# Altium footprint library PCB_Wearing_sensor.PcbLib: 55 footprints (part 3 of 4)
Each footprint in its own frame and in the unit in brackets; x right, y up, seen from the top. Pads: shape width x height; smd on the part's side, far side on the other; paste and mask are expansions set on the pad; w line width, h text height; cw(c..) or ccw(c..) is an arc to the next point about the centre after c.
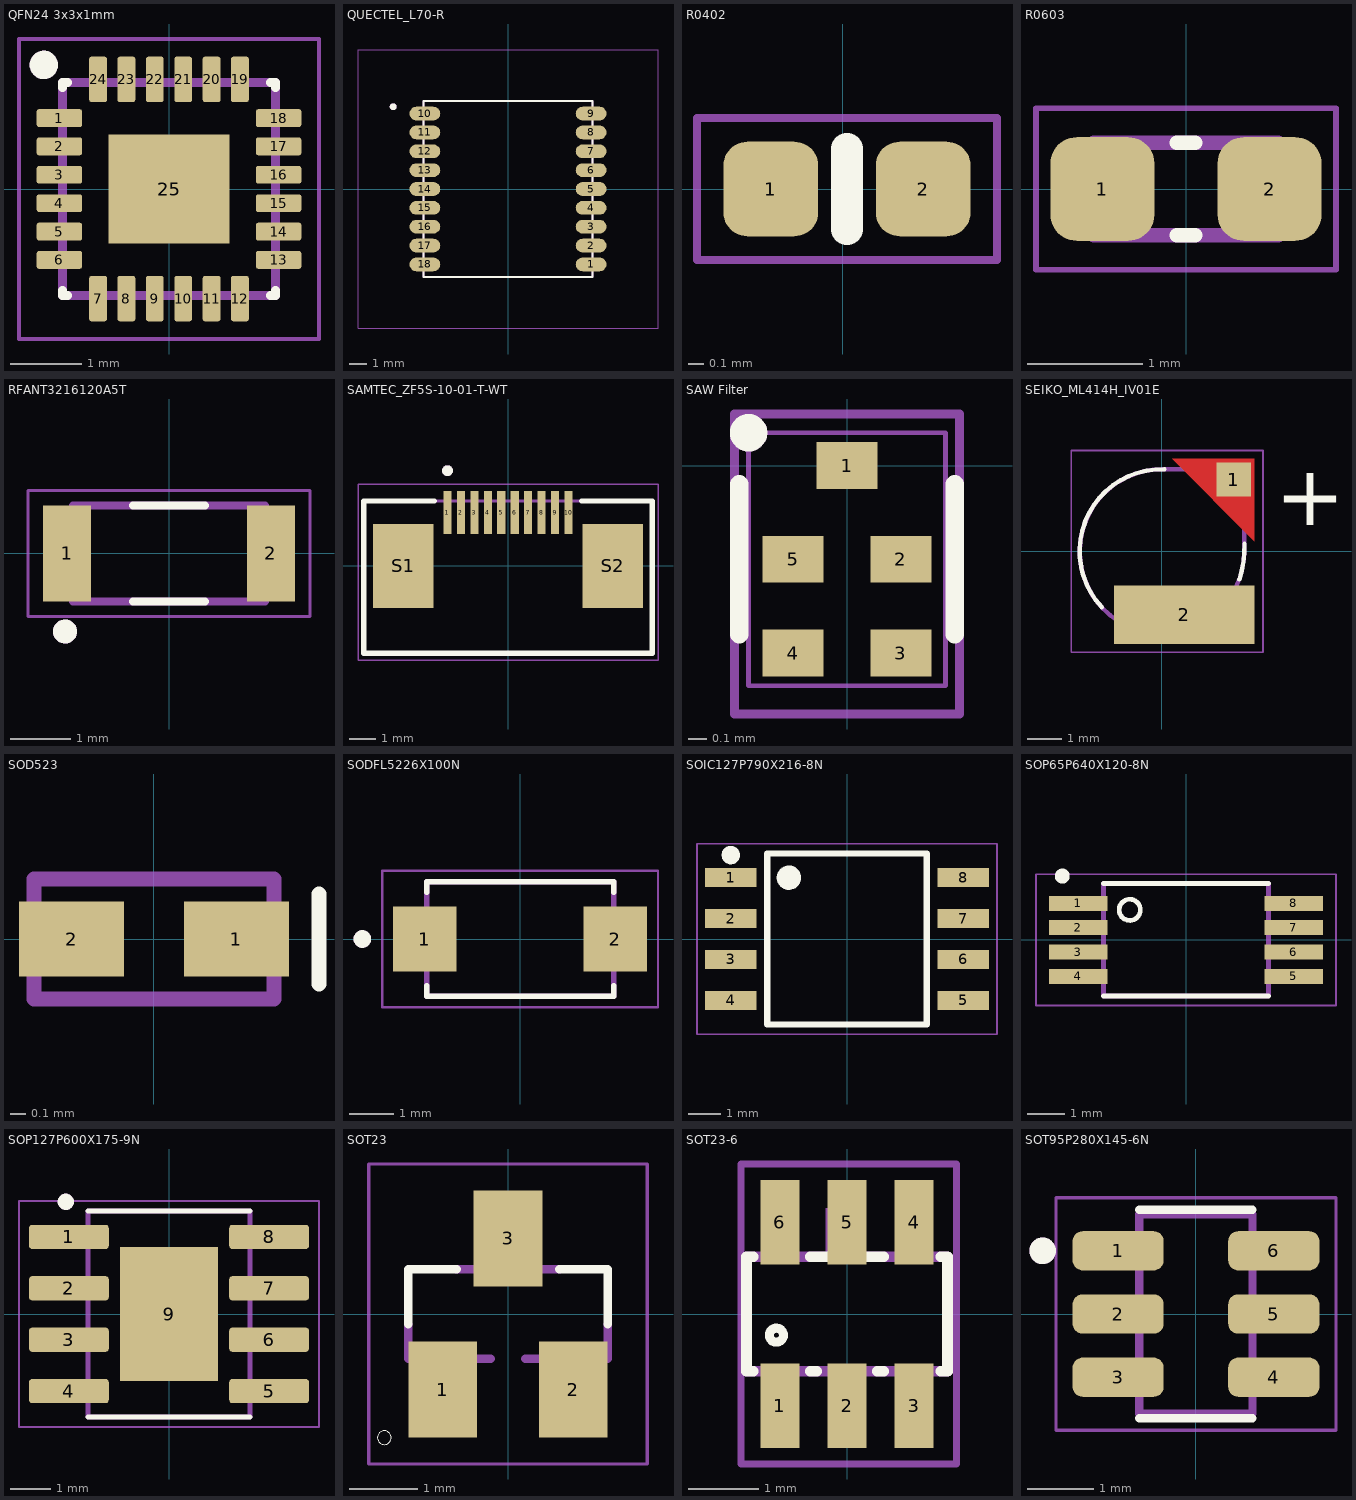
[diagram p2: the footprints below, top view; thin cyan lines are the x and y axes]

## QFN24 3x3x1mm [mm]
pads (25):
  rrect25% 0.64x0.25 smd: 1(-1.545,1) 2(-1.545,0.6) 3(-1.545,0.2) 4(-1.545,-0.2) 5(-1.545,-0.6) 6(-1.545,-1) 13(1.545,-1) 14(1.545,-0.6) 15(1.545,-0.2) 16(1.545,0.2) 17(1.545,0.6) 18(1.545,1)
  rrect25% 0.25x0.64 smd: 7(-1,-1.545) 8(-0.6,-1.545) 9(-0.2,-1.545) 10(0.2,-1.545) 11(0.6,-1.545) 12(1,-1.545) 19(1,1.545) 20(0.6,1.545) 21(0.2,1.545) 22(-0.2,1.545) 23(-0.6,1.545) 24(-1,1.545)
  rect 1.7x1.54 smd paste-2: 25(0,0)
Top Overlay:
  circle w0.2: c-1.765,1.75 r0.1
  lines w0.127: -1.5,-1.43 -1.5,-1.5 -1.43,-1.5 ; -1.5,1.43 -1.5,1.5 -1.43,1.5 ; 1.43,-1.5 1.5,-1.5 1.5,-1.43 ; 1.43,1.5 1.5,1.5 1.5,1.43
Top Paste:
  region: 0.538,-0.487 -0.538,-0.487 -0.538,0.487 0.538,0.487
Top Component Body:
  lines w0.127: -1.5,-1.5 -1.5,1.5 1.5,1.5 1.5,-1.5 -1.5,-1.5
Top Assy:
  text ".Designator" at -3.432,-0.345 h1.52
Top Courtyard (Mech8):
  lines w0.05: -2.115,-2.115 2.115,-2.115 2.115,2.115 -2.115,2.115 -2.115,-2.115
Mechanical 13:
  circle w0.2: c-1.765,1.75 r0.1
3D body "step_temp.STEP": height 1.05, standoff 0, extent -1.5,-1.5 1.5,1.5

## QUECTEL_L70-R [mm]
pads (18):
  oval 1.8x0.8 smd paste-2: 1(4.85,-4.4) 2(4.85,-3.3) 3(4.85,-2.2) 4(4.85,-1.1) 5(4.85,0) 6(4.85,1.1) 7(4.85,2.2) 8(4.85,3.3) 9(4.85,4.4) 10(-4.85,4.4) 11(-4.85,3.3) 12(-4.85,2.2) 13(-4.85,1.1) 14(-4.85,0) 15(-4.85,-1.1) 16(-4.85,-2.2) 17(-4.85,-3.3) 18(-4.85,-4.4)
Top Overlay:
  circle w0.2: c-6.7,4.8 r0.1
  lines w0.127: -4.925,-5.125 -4.925,5.125 4.925,5.125 4.925,-5.125 -4.925,-5.125
Top Paste:
  drawing of 18 lines, arcs and shapes, not listed
Top Assy:
  text ".Designator" at -3.432,-0.345 h1.52
Top Courtyard (Mech8):
  lines w0.05: -8.75,-8.125 -8.75,8.125 8.75,8.125 8.75,-8.125 -8.75,-8.125
Mechanical 13:
  circle w0.2: c-6.7,4.8 r0.1
  lines w0.127: -4.925,-5.125 -4.925,5.125 4.925,5.125 4.925,-5.125 -4.925,-5.125
3D body "step_temp.STEP": height 2.65, standoff 0, extent -4.85,-5.05 4.85,5.05

## R0402 [mm]
pads (2):
  rrect50% 0.6x0.6 smd: 1(-0.455,0) 2(0.51,0)
Top Overlay:
  lines w0.2: 0.028,-0.254 0.028,0 0.028,0.254
Top Courtyard (Mech8):
  lines w0.05: -0.923,-0.45 -0.923,0.45 0.978,0.45 0.978,-0.45 -0.923,-0.45
3D body "ERJ-U02J245X.STEP": height 0.35, standoff 0, extent -0.525,-0.25 0.475,0.25

## R0603 [mm]
pads (2):
  rrect50% 0.9x0.9 smd: 1(-0.725,0) 2(0.725,0)
Top Overlay:
  lines w0.127: -0.08,-0.4 0.08,-0.4 ; -0.08,0.4 0.08,0.4
Top Courtyard (Mech8):
  lines w0.05: -1.3,-0.7 1.3,-0.7 1.3,0.7 -1.3,0.7 -1.3,-0.7
Mechanical 13:
  lines w0.127: -0.8,-0.4 0.8,-0.4 0.8,0.4 -0.8,0.4 -0.8,-0.4
3D body "ERJU03J511V.STEP": height 0.45, standoff 0, extent -0.8,-0.406 0.8,0.394

## RFANT3216120A5T [mm]
height 1.4
pads (2):
  rect 0.8x1.6 smd: 1(-1.7,0) 2(1.7,0)
Top Overlay:
  circle w0.2: c-1.733,-1.3 r0.1
  lines w0.127: -0.6,-0.8 0.6,-0.8 ; -0.6,0.8 0.6,0.8
Top Courtyard (Mech8):
  lines w0.05: -2.35,-1.05 -2.35,1.05 2.35,1.05 2.35,-1.05 -2.35,-1.05
Mechanical 13:
  circle w0.2: c-1.733,-1.3 r0.1
  lines w0.127: -1.6,-0.8 -1.6,0.8 1.6,0.8 1.6,-0.8 -1.6,-0.8
3D body "step_temp.STEP": height 1.2, standoff 0, extent -1.6,-0.8 1.6,0.8

## SAMTEC_ZF5S-10-01-T-WT [mm]
pads (12):
  rect 0.3x1.6 smd: 1(-2.25,1.98) 2(-1.75,1.98) 3(-1.25,1.98) 4(-0.75,1.98) 5(-0.25,1.98) 6(0.25,1.98) 7(0.75,1.98) 8(1.25,1.98) 9(1.75,1.98) 10(2.25,1.98)
  rect 2.24x3.12 smd: S1(-3.897,0) S2(3.897,0)
Top Overlay:
  circle w0.2: c-2.25,3.54 r0.1
  lines w0.2: -2.747,2.41 -5.367,2.41 -5.367,-3.25 5.367,-3.25 5.367,2.41 2.747,2.41
Top Courtyard (Mech8):
  lines w0.05: -5.575,-3.5 -5.575,3.03 5.575,3.03 5.575,-3.5 -5.575,-3.5
Mechanical 13:
  circle w0.2: c-2.25,3.54 r0.1
  lines w0.1: -5.325,-3.25 -5.325,2.41 5.325,2.41 5.325,-3.25 -5.325,-3.25
3D body "ZF5S-10-01-T-WT.stp": height 2.05, standoff -0.05, extent -5.325,-3.25 5.325,2.42

## SAW Filter [mm]
pads (5):
  rect 0.325x0.25 smd paste-1 mask+0: 1(0,0) 2(0.288,-0.5) 3(0.288,-1) 4(-0.288,-1) 5(-0.288,-0.5)
Top Overlay:
  circle w0.1: c-0.525,0.175 r0.05
  lines w0.1: -0.575,-0.9 -0.575,-0.1 ; 0.575,-0.9 0.575,-0.1
Top Paste:
  circle w0.125: c0,0 r0.062
Top Component Body:
  lines w0.025: -0.525,-1.175 0.525,-1.175 0.525,0.175 -0.525,0.175 -0.525,-1.175
Top Courtyard (Mech8):
  lines w0.05: -0.6,-1.325 -0.6,0.275 0.6,0.275 0.6,-1.325 -0.6,-1.325
Mechanical 13:
  circle w0.1: c-0.525,0.175 r0.05

## SEIKO_ML414H_IV01E [mm]
pads (2):
  rect 1x1 smd paste-1 mask+0: 1(2.1,2.1)
  rect 4.1x1.7 smd: 2(0.65,-1.85)
Top Layer:
  region: 2.7,0.3 0.3,2.7 2.7,2.7
Top Overlay:
  lines w0.127: -1.76,-1.629 cw(c-0.008,0.005) 0.075,2.4 ; 2.263,-0.822 ccw(c-0.634,0.119) 2.41,0.225
  text "+" at 3.305,0.763 h1.78
Top Paste:
  region: 2.7,0.3 0.3,2.7 2.7,2.7
Top Solder:
  region: 2.8,0 0,2.8 2.8,2.8
Top Component Body:
  lines w0.127: 0,2.4 ccw(c0,0) 2.4,0 2.4,2.4 0,2.4
Top Assy:
  text ".Designator" at -3.432,-0.345 h1.52
Top Courtyard (Mech8):
  lines w0.05: -2.65,-2.95 2.95,-2.95 2.95,2.95 -2.65,2.95 -2.65,-2.95
3D body "step_temp.STEP": height 1.77, standoff 0, extent -2.4,-2.4 2.4,2.4

## SOD523 [mm]
pads (2):
  rect 0.7x0.5 smd: 1(0.55,0) 2(-0.55,0)
Top Overlay:
  lines w0.1: 1.1,-0.3 1.1,0.3
Top Component Body:
  lines w0.1: -0.8,-0.4 0.8,-0.4 0.8,0.4 -0.8,0.4 -0.8,-0.4
Top Assy:
  text ".Designator" at -3.432,-0.345 h1.52
3D body "1PS79SB70.STEP": height 0.65, standoff 0, extent -0.788,-0.376 0.812,0.424

## SODFL5226X100N [mm]
pads (2):
  rect 1.44x1.48 smd: 1(-2.165,0) 2(2.165,0)
Top Overlay:
  circle w0.2: c-3.585,0 r0.1
  lines w0.127: -2.125,-1.06 -2.125,-1.3 2.125,-1.3 2.125,-1.06 ; -2.125,1.06 -2.125,1.3 2.125,1.3 2.125,1.06
Top Assy:
  lines w0.127: -2.125,-1.3 -2.125,1.3 2.125,1.3 2.125,-1.3 -2.125,-1.3
Top Courtyard (Mech8):
  lines w0.05: -3.135,-1.55 -3.135,1.55 3.135,1.55 3.135,-1.55 -3.135,-1.55
Mechanical 13:
  circle w0.2: c-3.585,0 r0.1
3D body "step_temp.STEP": height 1, standoff 0, extent -2.6,-1.3 2.6,1.299

## SOIC127P790X216-8N [mm]
pads (8):
  rect 1.6x0.6 smd: 1(-3.6,1.905) 2(-3.6,0.635) 3(-3.6,-0.635) 4(-3.6,-1.905) 5(3.6,-1.905) 6(3.6,-0.635) 7(3.6,0.635) 8(3.6,1.905)
Top Overlay:
  circle w0.127: c-1.8,1.9 r0.316
  circle w0.127: c-1.8,1.9 r0.224
  circle w0.127: c-1.8,1.9 r0.141
  circle w0.127: c-1.8,1.9 r0.1
  circle w0.127: c-1.8,1.8 r0.1
  circle w0.127: c-3.6,2.6 r0.224
  circle w0.127: c-3.5,2.6 r0.1
  circle w0.127: c-3.6,2.6 r0.1
  lines w0.2: -2.475,-2.65 2.475,-2.65 2.475,2.65 -2.475,2.65 -2.475,-2.65
Top Assy:
  text ".Designator" at -3.432,-0.345 h1.52
Top Courtyard (Mech8):
  lines w0.05: -4.65,-2.95 4.65,-2.95 4.65,2.95 -4.65,2.95 -4.65,-2.95
3D body "W25Q32JVSSIQ--3DModel-STEP-269445.STEP": height 2.16, standoff 0, extent -3.95,-2.64 3.95,2.64

## SOP65P640X120-8N [mm]
pads (8):
  rect 1.56x0.4 smd: 1(-2.88,0.975) 2(-2.88,0.325) 3(-2.88,-0.325) 4(-2.88,-0.975) 5(2.88,-0.975) 6(2.88,-0.325) 7(2.88,0.325) 8(2.88,0.975)
Top Overlay:
  circle w0.2: c-3.3,1.7 r0.1
  circle w0.127: c-1.5,0.8 r0.283
  lines w0.127: -2.2,-1.5 2.2,-1.5 ; -2.2,1.5 2.2,1.5
Top Component Body:
  lines w0.127: -2.2,-1.5 2.2,-1.5 2.2,1.5 -2.2,1.5 -2.2,-1.5
Top Assy:
  text ".Designator" at -2.253,-0.226 h1
Top Courtyard (Mech8):
  lines w0.05: -4,-1.75 4,-1.75 4,1.75 -4,1.75 -4,-1.75
3D body "LM2903PWRG3.STEP": height 1.2, standoff 0, extent -3.2,-1.5 3.2,1.5

## SOP127P600X175-9N [mm]
height 1.75
pads (9):
  rrect25% 1.97x0.6 smd: 1(-2.475,1.905) 2(-2.475,0.635) 3(-2.475,-0.635) 4(-2.475,-1.905) 5(2.475,-1.905) 6(2.475,-0.635) 7(2.475,0.635) 8(2.475,1.905)
  rect 2.413x3.302 smd paste-3: 9(0,0)
Top Overlay:
  circle w0.2: c-2.553,2.775 r0.1
  lines w0.127: -2,-2.55 2,-2.55 ; -2,2.55 2,2.55
Top Paste:
  region: 0.645,-0.82 -0.645,-0.82 -0.645,0.82 0.645,0.82
Top Courtyard (Mech8):
  lines w0.05: -3.71,-2.8 3.71,-2.8 3.71,2.8 -3.71,2.8 -3.71,-2.8
Mechanical 13:
  circle w0.2: c-2.553,2.775 r0.1
  lines w0.127: -2,-2.55 -2,2.55 2,2.55 2,-2.55 -2,-2.55
3D body "step_temp.STEP": height 1.75, standoff 0, extent -3,-2.45 3,2.45

## SOT23 [mm]
pads (3):
  rect 1x1.4 smd: 1(-0.95,-1.1) 2(0.95,-1.1) 3(0,1.1)
Top Overlay:
  circle w0: c-1.8,-1.8 r0.1
  lines w0.127: -1.45,-0.15 -1.45,0.65 -0.75,0.65 ; 0.75,0.65 1.45,0.65 1.45,-0.15
Top Component Body:
  region: -0.711,-1.298 -1.171,-1.298 -1.171,-0.711 -0.711,-0.711
  region: 1.168,-1.296 0.712,-1.296 0.712,-0.711 1.168,-0.711
  lines w0.127: -1.45,-0.15 -1.45,-0.65 -0.25,-0.65 ; -0.75,0.65 0.75,0.65 ; 0.25,-0.65 1.45,-0.65 1.45,-0.15
Top Assy:
  text ".Designator" at -3.432,-0.345 h1.52
Top Courtyard (Mech8):
  lines w0.051: -2.023,-2.183 -2.023,2.183 2.023,2.183 2.023,-2.183 -2.023,-2.183
Mechanical 13:
  region: 0.229,0.711 -0.229,0.711 -0.229,1.295 0.229,1.295
3D body "MMBT3904.STEP": height 1.1, standoff 0, extent -1.45,-1.25 1.45,1.25

## SOT23-6 [mm]
pads (6):
  rect 0.55x1.2 smd: 1(-0.95,-1.3) 2(0,-1.3) 3(0.95,-1.3) 4(0.95,1.3) 5(0,1.3) 6(-0.95,1.3)
Top Overlay:
  circle w0.127: c-1,-0.3 r0.1
  lines w0.152: -1.328,-0.81 -1.422,-0.81 -1.422,0.81 -1.328,0.81 ; -0.522,-0.81 -0.428,-0.81 ; -0.522,0.81 0.522,0.81 ; 0.428,-0.81 0.522,-0.81 ; 1.328,-0.81 1.422,-0.81 1.422,0.81 1.328,0.81
Top Courtyard (Mech8):
  lines w0.1: -1.5,-2.125 1.55,-2.125 1.55,2.125 -1.5,2.125 -1.5,-2.125
Mechanical 13:
  region: 0.2,0.85 -0.3,0.85 -0.3,1.5 0.2,1.5
  region: -0.7,0.85 -1.2,0.85 -1.2,1.5 -0.7,1.5
  region: 1.2,0.85 0.7,0.85 0.7,1.5 1.2,1.5
  region: 1.2,-1.5 0.7,-1.5 0.7,-0.85 1.2,-0.85
  region: 0.25,-1.5 -0.25,-1.5 -0.25,-0.85 0.25,-0.85
  region: -0.7,-1.5 -1.2,-1.5 -1.2,-0.85 -0.7,-0.85
  lines w0.152: -1.422,-0.81 1.422,-0.81 ; -1.422,0.81 1.422,0.81
3D body "step_temp.STEP": height 1.45, standoff 0, extent -1.45,-1.4 1.45,1.4

## SOT95P280X145-6N [mm]
height 1.45
pads (6):
  rrect50% 1.37x0.59 smd: 1(-1.17,0.95) 2(-1.17,0) 3(-1.17,-0.95) 4(1.17,-0.95) 5(1.17,0) 6(1.17,0.95)
Top Overlay:
  circle w0.2: c-2.305,0.95 r0.1
  lines w0.127: -0.85,-1.565 0.85,-1.565 ; -0.85,1.565 0.85,1.565
Top Courtyard (Mech8):
  lines w0.05: -2.105,-1.75 -2.105,1.75 2.105,1.75 2.105,-1.75 -2.105,-1.75
Mechanical 13:
  circle w0.2: c-2.305,0.95 r0.1
  lines w0.127: -0.85,-1.5 -0.85,1.5 0.85,1.5 0.85,-1.5 -0.85,-1.5
3D body "step_temp.STEP": height 1.45, standoff 0, extent -1.4,-1.45 1.4,1.45